# Altium integrated library BJT.IntLib: 10 symbols
Pins are listed as number, name and electrical type; pins without a type are passive.

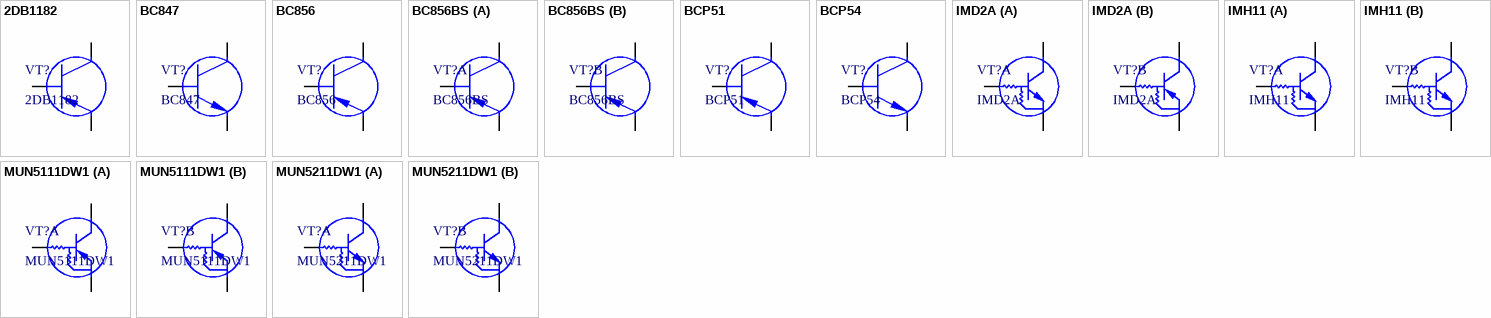
[diagram p0: symbols 2DB1182 to MUN5211DW1]

## 2DB1182
designator VT?
PNP 10W Transistor 32V; ComponentDescription: 2DB1182
footprint DPAK229P970X230-3N (D-PAK, 3-Pads, Body 6,20x6,71mm (max), IPC Medium Density)
pins: 1 B, 2 C, 3 E

## BC847
designator VT?
NPN Transistor 100mA 60V; ComponentDescription: BC847
footprint SOT95P230X110-3N (SOT23, 3-Leads, Body 2,90x2,30mm, Pitch 0,95mm, IPC Medium Density)
pins: 1 B, 2 E, 3 C

## BC856
designator VT?
PNP Transistor 100mA 60V; ComponentDescription: BC856
footprint SOT95P230X110-3N (SOT23, 3-Leads, Body 2,90x2,30mm, Pitch 0,95mm, IPC Medium Density)
pins: 1 B, 2 E, 3 C

## BC856BS
designator VT?
2PNP Transistor 100mA 60V; ComponentDescription: BC856BS
footprint SOTFL65P210X110-6N (SOTFL, 6-Leads, Body 2,00x2,10mm, Pitch 0,65mm, IPC Medium Density)
part A pins: 1 E, 2 B, 6 C
part B pins: 3 C, 4 E, 5 B

## BCP51
designator VT?
PNP Transistor 1.2W; ComponentDescription: BCP51
footprint SOT230P700X180-4N (SOT223, 4-Leads, Body 6,50x7,00mm (avg), Pitch 2,30mm, IPC Medium Density)
pins: 1 B, 2 C, 3 E

## BCP54
designator VT?
NPN Transistor 1.2W; ComponentDescription: BCP54
footprint SOT230P700X180-4N (SOT223, 4-Leads, Body 6,50x7,00mm (avg), Pitch 2,30mm, IPC Medium Density)
pins: 1 B, 2 C, 3 E

## IMD2A
designator VT?
R1,R2 22kOhm; ComponentDescription: IMD2A
footprint SC-74 \ SOT-457 MIRROR (SOP, 6-Leads, Body 3,18x1,80mm, Pitch 0,95mm, IPC Medium Density)
part A pins: 1 C, 5 B, 6 E
part B pins: 2 B, 3 E, 4 C

## IMH11
designator VT?
R1,R2 10kOhm; ComponentDescription: IMH11
footprint SC-74 \ SOT-457 MIRROR (SOP, 6-Leads, Body 3,18x1,80mm, Pitch 0,95mm, IPC Medium Density)
part A pins: 1 C, 5 B, 6 E
part B pins: 2 B, 3 E, 4 C

## MUN5111DW1
designator VT?
Dual PNP, R1,R2 10kOhm; ComponentDescription: MUN5111DW1
footprint SOTFL65P210X110-6N (SOTFL, 6-Leads, Body 2,00x2,10mm, Pitch 0,65mm, IPC Medium Density)
part A pins: 1 E, 2 B, 6 C
part B pins: 3 C, 4 E, 5 B

## MUN5211DW1
designator VT?
Dual NPN, R1,R2 10kOhm; ComponentDescription: MUN5211DW1
footprint SOTFL65P210X110-6N (SOTFL, 6-Leads, Body 2,00x2,10mm, Pitch 0,65mm, IPC Medium Density)
part A pins: 1 E, 2 B, 6 C
part B pins: 3 C, 4 E, 5 B